# Altium footprint library Transformer_ETD.PcbLib: 9 footprints
Each footprint in its own frame and in the unit in brackets; x right, y up, seen from the top. Pads: shape width x height; smd on the part's side, far side on the other; paste and mask are expansions set on the pad; w line width, h text height; cw(c..) or ccw(c..) is an arc to the next point about the centre after c.
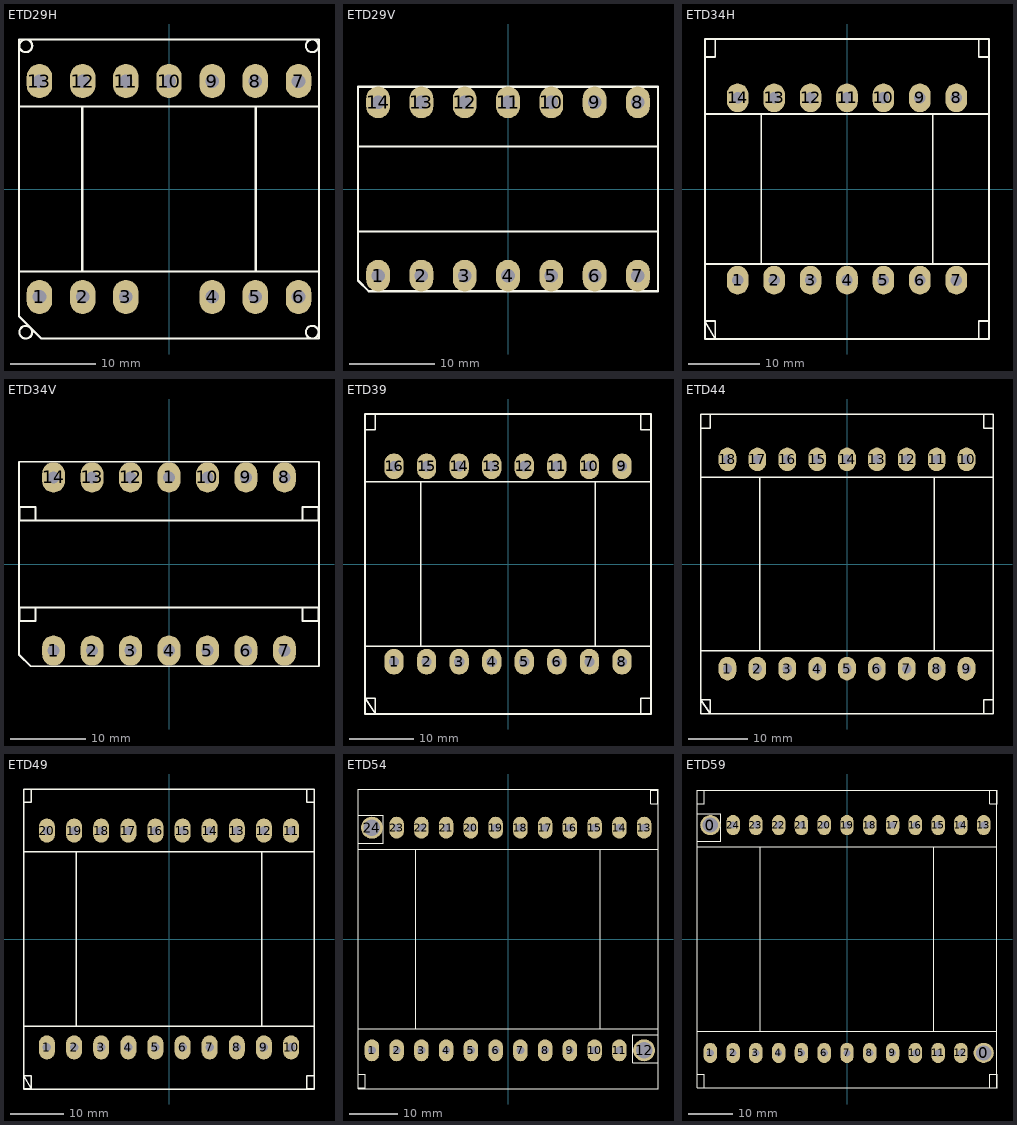
[diagram p0: the footprints below, top view; thin cyan lines are the x and y axes]

## ETD29H [mm]
pads (13):
  oval 3x4 hole 1.6: 1(-15.24,-12.7) 2(-10.16,-12.7) 3(-5.08,-12.7) 4(5.08,-12.7) 5(10.16,-12.7) 6(15.24,-12.7) 7(15.24,12.7) 8(10.16,12.7) 9(5.08,12.7) 10(0,12.7) 11(-5.08,12.7) 12(-10.16,12.7) 13(-15.24,12.7)
Top Overlay:
  circle w0.254: c16.85,16.85 r0.75
  circle w0.254: c-16.85,-16.85 r0.75
  circle w0.254: c-16.85,16.85 r0.75
  circle w0.254: c16.85,-16.85 r0.75
  lines w0.254: -17.65,-9.7 0,-9.7 17.65,-9.7 ; -17.65,9.7 0,9.7 17.65,9.7 ; -10.2,-9.7 -10.2,0 -10.2,9.7 ; 10.2,-9.7 10.2,0 10.2,9.7 ; -17.65,-14.989 -15.039,-17.6 0,-17.6 17.65,-17.6 17.65,0 17.65,17.6 0,17.6 -17.65,17.6 -17.65,0 -17.65,-14.989
3D body "ETD29HTransformer.STEP": height 24.86, standoff -3.5, extent -17.6,-17.9 17.6,17.9

## ETD29V [mm]
pads (14):
  oval 2.8x3.7 hole 1.6: 1(-15.24,-10.16) 2(-10.16,-10.16) 3(-5.08,-10.16) 4(0,-10.16) 5(5.08,-10.16) 6(10.16,-10.16) 7(15.24,-10.16) 8(15.24,10.16) 9(10.16,10.16) 10(5.08,10.16) 11(0,10.16) 12(-5.08,10.16) 13(-10.16,10.16) 14(-15.24,10.16)
Top Overlay:
  lines w0.254: -17.6,-5 0,-5 17.6,-5 ; -17.6,5 0,5 17.6,5 ; -17.6,-10.73 -16.33,-12 0,-12 17.6,-12 17.6,0 17.6,12 0,12 -17.6,12 -17.6,0 -17.6,-10.73
3D body "ETD29VTransformer.STEP": height 41.31, standoff -3.6, extent -17.6,-12 17.6,12

## ETD34H [mm]
pads (14):
  oval 3x4 hole 1.6: 1(-15.24,-12.7) 2(-10.16,-12.7) 3(-5.08,-12.7) 4(0,-12.7) 5(5.08,-12.7) 6(10.16,-12.7) 7(15.24,-12.7) 8(15.24,12.7) 9(10.16,12.7) 10(5.08,12.7) 11(0,12.7) 12(-5.08,12.7) 13(-10.16,12.7) 14(-15.24,12.7)
Top Overlay:
  lines w0.254: -19.8,-18.784 -19.8,0 -19.8,20.9 ; -19.8,-10.45 0,-10.45 19.8,-10.45 ; -19.8,10.45 0,10.45 19.8,10.45 ; -11.96,-10.45 -11.96,0 -11.96,10.45 ; 11.96,-10.45 11.96,0 11.96,10.45 ; -19.8,-20.9 -18.35,-20.9 ; -19.8,-20.9 -19.8,-18.4 ; -19.8,-20.9 0,-20.9 19.8,-20.9 ; -19.8,-18.4 -18.35,-18.4 -18.35,-20.9 ; -19.8,-18.4 -18.35,-20.9 ; -19.8,20.9 -18.35,20.9 -18.35,18.4 -19.8,18.4 -19.8,20.9 ; -19.8,20.9 0,20.9 19.8,20.9 ; 19.8,-20.9 18.35,-20.9 18.35,-18.4 19.8,-18.4 19.8,-20.9 ; 19.8,-20.9 19.8,0 19.8,20.9 ; 19.8,20.9 18.35,20.9 18.35,18.4 19.8,18.4 19.8,20.9
3D body "ETD34HTransformer.STEP": height 32.89, standoff -4.5, extent -19.8,-20.7 19.8,20.7

## ETD34V [mm]
pads (14):
  oval 3x4 hole 1.6: 1(-15.24,-11.43) 1(0,11.43) 2(-10.16,-11.43) 3(-5.08,-11.43) 4(0,-11.43) 5(5.08,-11.43) 6(10.16,-11.43) 7(15.24,-11.43) 8(15.24,11.43) 9(10.16,11.43) 10(5.08,11.43) 12(-5.08,11.43) 13(-10.16,11.43) 14(-15.24,11.43)
Top Overlay:
  lines w0.254: -19.8,-5.725 0,-5.725 19.8,-5.725 ; -19.8,5.725 0,5.725 19.8,5.725 ; -19.8,-11.95 -19.8,0 -19.8,13.5 0,13.5 19.8,13.5 19.8,0 19.8,-13.5 0,-13.5 -18.25,-13.5 -19.8,-11.95 ; -19.75,-7.5 -17.65,-7.5 -17.65,-5.75 -19.75,-5.75 -19.75,-7.5 ; -19.75,5.75 -17.65,5.75 -17.65,7.5 -19.75,7.5 -19.75,5.75 ; 17.65,-7.5 19.75,-7.5 19.75,-5.75 17.65,-5.75 17.65,-7.5 ; 17.65,5.75 19.75,5.75 19.75,7.5 17.65,7.5 17.65,5.75
3D body "ETD34VTransformer.STEP": height 45.6, standoff -5.5, extent -19.8,-13.5 19.8,13.5

## ETD39 [mm]
pads (16):
  oval 3x4 hole 1.6: 1(-17.78,-15.24) 2(-12.7,-15.24) 3(-7.62,-15.24) 4(-2.54,-15.24) 5(2.54,-15.24) 6(7.62,-15.24) 7(12.7,-15.24) 8(17.78,-15.24) 9(17.78,15.24) 10(12.7,15.24) 11(7.62,15.24) 12(2.54,15.24) 13(-2.54,15.24) 14(-7.62,15.24) 15(-12.7,15.24) 16(-17.78,15.24)
Top Overlay:
  lines w0.254: -22.3,-12.85 0,-12.85 22.3,-12.85 ; -22.3,12.85 0,12.85 22.3,12.85 ; -13.62,-12.85 -13.62,0 -13.62,12.85 ; 13.62,-12.85 13.62,0 13.62,12.85 ; -22.3,-20.94 -20.7,-20.94 -20.7,-23.34 ; -22.3,-20.94 -22.3,-23.34 -20.7,-23.34 ; -22.3,-20.94 -20.7,-23.34 ; -22.3,-23.4 0,-23.4 22.3,-23.4 22.3,0 22.3,23.4 0,23.4 -22.3,23.4 -22.3,0 -22.3,-23.4 ; -22.3,20.94 -20.7,20.94 -20.7,23.34 -22.3,23.34 -22.3,20.94 ; 20.7,-23.34 22.3,-23.34 22.3,-20.94 20.7,-20.94 20.7,-23.34 ; 20.7,20.94 22.3,20.94 22.3,23.34 20.7,23.34 20.7,20.94
3D body "ETD39Transformer.STEP": height 35.46, standoff -4.5, extent -22.3,-23.4 22.3,23.4

## ETD44 [mm]
pads (18):
  oval 3x4 hole 1.6: 1(-20.32,-17.78) 2(-15.24,-17.78) 3(-10.16,-17.78) 4(-5.08,-17.78) 5(0,-17.78) 6(5.08,-17.78) 7(10.16,-17.78) 8(15.24,-17.78) 9(20.32,-17.78) 10(20.32,17.78) 11(15.24,17.78) 12(10.16,17.78) 13(5.08,17.78) 14(0,17.78) 15(-5.08,17.78) 16(-10.16,17.78) 17(-15.24,17.78) 18(-20.32,17.78)
Top Overlay:
  lines w0.254: -24.84,-14.75 0,-14.75 24.84,-14.75 ; -24.84,14.75 0,14.75 24.84,14.75 ; -14.85,-14.75 -14.85,0 -14.85,14.75 ; 14.85,-14.75 14.85,0 14.85,14.75 ; -24.84,-25.5 -23.24,-25.5 ; -24.84,-25.5 -24.84,-23.1 ; -24.84,-25.5 -24.84,0 -24.84,25.5 ; -24.84,-25.5 0,-25.5 24.84,-25.5 ; -24.84,-23.1 -23.24,-23.1 -23.24,-25.5 ; -24.84,-23.1 -23.24,-25.5 ; -24.84,25.5 -23.24,25.5 -23.24,23.1 -24.84,23.1 -24.84,25.5 ; -24.84,25.5 0,25.5 24.84,25.5 ; 24.84,-25.5 23.24,-25.5 23.24,-23.1 24.84,-23.1 24.84,-25.5 ; 24.84,-25.5 24.84,0 24.84,25.5 ; 24.84,25.5 23.24,25.5 23.24,23.1 24.84,23.1 24.84,25.5
3D body "ETD44Transformer.STEP": height 38.08, standoff -4.5, extent -24.8,-25.5 24.8,25.5

## ETD49 [mm]
pads (20):
  oval 3x4.5 hole 1.6: 1(-22.86,-20.32) 2(-17.78,-20.32) 3(-12.7,-20.32) 4(-7.62,-20.32) 5(-2.54,-20.32) 6(2.54,-20.32) 7(7.62,-20.32) 8(12.7,-20.32) 9(17.78,-20.32) 10(22.86,-20.32) 11(22.86,20.32) 12(17.78,20.32) 13(12.7,20.32) 14(7.62,20.32) 15(2.54,20.32) 16(-2.54,20.32) 17(-7.62,20.32) 18(-12.7,20.32) 19(-17.78,20.32) 20(-22.86,20.32)
Top Overlay:
  lines w0.254: -27.25,-16.35 0,-16.35 27.25,-16.35 ; -27.25,16.35 0,16.35 27.25,16.35 ; -17.39,-16.35 -17.39,0 -17.39,16.35 ; 17.39,-16.35 17.39,0 17.39,16.35 ; -27.25,-25.64 -25.8,-25.64 -25.8,-28.04 ; -27.25,-25.64 -27.25,-28.04 -25.8,-28.04 ; -27.25,-25.64 -25.8,-28.04 ; -27.25,-28.1 -27.25,0 -27.25,28.1 0,28.1 27.25,28.1 27.25,0 27.25,-28.1 0,-28.1 -27.25,-28.1 ; -27.25,25.64 -25.8,25.64 -25.8,28.04 -27.25,28.04 -27.25,25.64 ; 25.8,-28.04 27.25,-28.04 27.25,-25.64 25.8,-25.64 25.8,-28.04 ; 25.8,25.64 27.25,25.64 27.25,28.04 25.8,28.04 25.8,25.64
3D body "ETD49Transformer.STEP": height 40.56, standoff -4.5, extent -27.25,-28.1 27.25,28.1

## ETD54 [mm]
pads (24):
  oval 3x4.5 hole 1.6: 1(-27.94,-22.86) 2(-22.86,-22.86) 3(-17.78,-22.86) 4(-12.7,-22.86) 5(-7.62,-22.86) 6(-2.54,-22.86) 7(2.54,-22.86) 8(7.62,-22.86) 9(12.7,-22.86) 10(17.78,-22.86) 11(22.86,-22.86) 13(27.94,22.86) 14(22.86,22.86) 15(17.78,22.86) 16(12.7,22.86) 17(7.62,22.86) 18(2.54,22.86) 19(-2.54,22.86) 20(-7.62,22.86) 21(-12.7,22.86) 22(-17.78,22.86) 23(-22.86,22.86)
  round 4.5 hole 3.4: 12(27.94,-22.86) 24(-27.94,22.86)
Top Overlay:
  lines w0.254: -30.8,-18.4 0,-18.4 30.8,-18.4 ; -30.8,18.4 0,18.4 30.8,18.4 ; -30.8,19.7 -25.59,19.7 -25.59,25.44 -30.8,25.44 ; -18.9,-18.4 -18.9,0 -18.9,18.4 ; 18.9,-18.4 18.9,0 18.9,18.4 ; 30.8,-25.44 25.59,-25.44 25.59,-19.7 30.8,-19.7 ; -30.8,-30.7 -30.8,0 -30.8,30.7 0,30.7 30.8,30.7 30.8,0 30.8,-30.7 0,-30.7 -30.8,-30.7 ; -30.725,-30.58 -29.275,-30.58 -29.275,-27.813 -30.725,-27.813 -30.725,-30.58 ; 29.275,27.813 30.725,27.813 30.725,30.58 29.275,30.58 29.275,27.813
3D body "ETD54Transformer.STEP": height 45.41, standoff -4.5, extent -30.75,-30.7 30.75,30.7

## ETD59 [mm]
pads (26):
  round 4.5 hole 3.4: 0(-30.48,25.4) 0(30.48,-25.4)
  oval 3x4.5 hole 1.6: 1(-30.48,-25.4) 2(-25.4,-25.4) 3(-20.32,-25.4) 4(-15.24,-25.4) 5(-10.16,-25.4) 6(-5.08,-25.4) 7(0,-25.4) 8(5.08,-25.4) 9(10.16,-25.4) 10(15.24,-25.4) 11(20.32,-25.4) 12(25.4,-25.4) 13(30.48,25.4) 14(25.4,25.4) 15(20.32,25.4) 16(15.24,25.4) 17(10.16,25.4) 18(5.08,25.4) 19(0,25.4) 20(-5.08,25.4) 21(-10.16,25.4) 22(-15.24,25.4) 23(-20.32,25.4) 24(-25.4,25.4)
Top Overlay:
  lines w0.254: -33.45,-20.6 0,-20.6 33.45,-20.6 ; -33.45,20.6 0,20.6 33.45,20.6 ; -33.34,21.844 -28.13,21.844 -28.13,27.98 -33.34,27.98 ; -19.35,-20.6 -19.35,0 -19.35,20.6 ; 19.35,-20.6 19.35,0 19.35,20.6 ; -33.45,-33.12 -31.85,-33.12 -31.85,-30.12 -33.45,-30.12 -33.45,-33.12 ; -33.45,-33.12 0,-33.12 33.45,-33.12 ; -33.45,-33.12 -33.45,0 -33.45,33.12 ; -33.45,33.12 -31.85,33.12 -31.85,30.12 -33.45,30.12 -33.45,33.12 ; -33.45,33.12 0,33.12 33.45,33.12 ; 33.45,-33.12 31.85,-33.12 31.85,-30.12 33.45,-30.12 33.45,-33.12 ; 33.45,-33.12 33.45,0 33.45,33.12 ; 33.45,33.12 31.85,33.12 31.85,30.12 33.45,30.12 33.45,33.12
3D body "ETD59Transformer.STEP": height 48.32, standoff -4.5, extent -33.45,-33.1 33.45,33.1